# Altium footprint library klp.PcbLib: 436 footprints (part 25 of 28)
Each footprint in its own frame and in the unit in brackets; x right, y up, seen from the top. Pads: shape width x height; smd on the part's side, far side on the other; paste and mask are expansions set on the pad; w line width, h text height; cw(c..) or ccw(c..) is an arc to the next point about the centre after c.
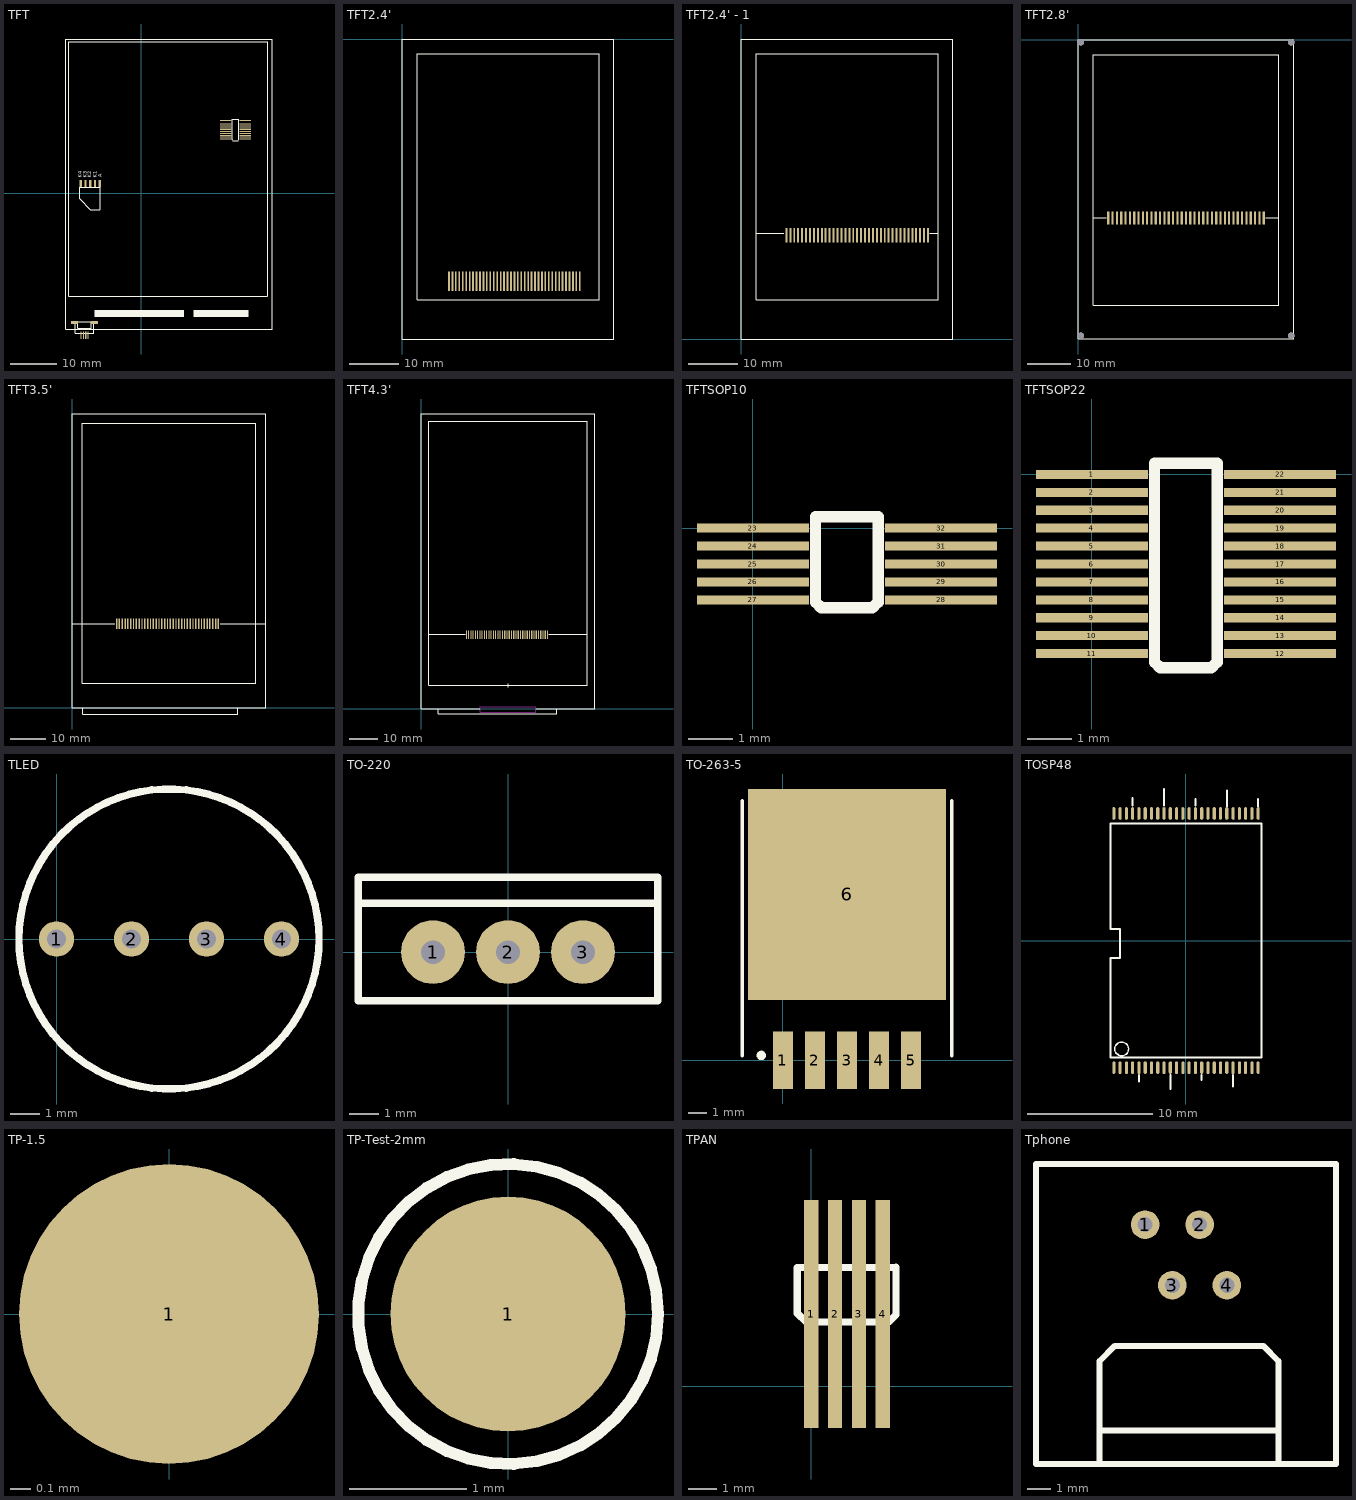
[diagram p24: the footprints below, top view; thin cyan lines are the x and y axes]

## TFT [mil] "TFTLCD_34"
height 196.85
pads (33):
  rect 98.43x8 smd: 1(710,615) 2(710,599.25) 3(710,583.5) 4(710,567.76) 5(710,552.01) 6(710,536.26) 7(710,520.51) 8(710,504.76) 9(710,489.02) 10(710,473.27) 11(710,457.52) 12(875.35,457.52) 13(875.35,473.27) 14(875.35,489.02) 15(875.35,504.76) 16(875.35,520.51) 17(875.35,536.26) 18(875.35,552.01) 19(875.35,567.76) 20(875.35,583.5) 21(875.35,599.25) 22(875.35,615)
  rect 19.68x59.05 smd: 23(-350,83.9) 24(-390,83.9) 26(-470,83.9) 27(-510,83.9)
  rect 19.68x59.06 smd: 25(-430,83.9)
  rect 10x62.99 smd: 28(-508,-1194) 29(-488,-1194) 30(-469,-1194) 31(-449,-1194)
  rect 59.06x23.62 smd: ""(-563,-1087) ""(-395,-1087)
Top Overlay:
  rectangle: 440,-1040 900,-980
  rectangle: -395,-1040 360,-980
  lines w10: -537,-1079.57 -537,-1133 -534,-1136 -424,-1136 -421,-1133 -421,-1079.57 ; -400.52,-1178 -558,-1178 -558,-1079.57 -400,-1079.57 -400,-1178 ; -350,-136.1 -430,-136.1 -520,-46.1 -520,53.9 -345,53.9 -345,-16.1 -345,-136.1 ; -635,-1145 -635,1300 1100,1300 1100,900 1100,-895 1100,-1145 -635,-1145 ; -610,-865.35 1060,-865.35 1065,-860.35 1065,1275 -610,1275 -610,-865.35 ; 765,450 770,445 815,445 820,450 820,625 765,625 765,450
  text "A" at -335,135 h30
  text "K1" at -375,130 h30
  text "K2" at -420,130 h30
  text "K3" at -460,130 h30
  text "K4" at -500,130 h30

## TFT2.4' [mm] "TFT,LCD,320*240,2.4',TOUCH,8/16bit"
height 5
pads (39):
  rect 0.35x4 smd: 1(9.5,-49.25) 2(10.2,-49.25) 3(10.9,-49.25) 4(11.6,-49.25) 5(12.3,-49.25) 6(13,-49.25) 7(13.7,-49.25) 8(14.4,-49.25) 9(15.1,-49.25) 10(15.8,-49.25) 11(16.5,-49.25) 12(17.2,-49.25) 13(17.9,-49.25) 14(18.6,-49.25) 15(19.3,-49.25) 16(20,-49.25) 17(20.7,-49.25) 18(21.4,-49.25) 19(22.1,-49.25) 20(22.8,-49.25) 21(23.5,-49.25) 22(24.2,-49.25) 23(24.9,-49.25) 24(25.6,-49.25) 25(26.3,-49.25) 26(27,-49.25) 27(27.7,-49.25) 28(28.4,-49.25) 29(29.1,-49.25) 30(29.8,-49.25) 31(30.5,-49.25) 32(31.2,-49.25) 33(31.9,-49.25) 34(32.6,-49.25) 35(33.3,-49.25) 36(34,-49.25) 37(34.7,-49.25) 38(35.4,-49.25) 39(36.1,-49.25)
Top Overlay:
  lines w0.254: 0,-61 43,-61 43,0 0,0 0,-61 ; 3.048,-53.048 40.005,-53.048 40.005,-3.048 3.048,-3.048 3.048,-53.048

## TFT2.4' - 1 [mm] "TFT,LCD,320*240,2.4',TOUCH,8/16bit,GENE"
height 5
pads (37):
  rect 0.4x3 smd: 1(9.173,21.082) 2(9.973,21.082) 3(10.773,21.082) 4(11.573,21.082) 5(12.373,21.082) 6(13.173,21.082) 7(13.973,21.082) 8(14.773,21.082) 9(15.573,21.082) 10(16.373,21.082) 11(17.173,21.082) 12(17.973,21.082) 13(18.773,21.082) 14(19.573,21.082) 15(20.373,21.082) 16(21.173,21.082) 17(21.973,21.082) 18(22.773,21.082) 19(23.573,21.082) 20(24.373,21.082) 21(25.173,21.082) 22(25.973,21.082) 23(26.773,21.082) 24(27.573,21.082) 25(28.373,21.082) 26(29.173,21.082) 27(29.973,21.082) 28(30.773,21.082) 29(31.573,21.082) 30(32.373,21.082) 31(33.173,21.082) 32(33.973,21.082) 33(34.773,21.082) 34(35.573,21.082) 35(36.373,21.082) 36(37.173,21.082) 37(37.973,21.082)
Top Overlay:
  lines w0.254: 3.175,21.463 8.636,21.463 ; 38.354,21.463 40.005,21.463 ; 0,0 0,61 43,61 43,0 0,0 ; 3.048,7.952 3.048,57.952 40.005,57.952 40.005,7.952 3.048,7.952

## TFT2.8' [mm] "TFT,LCD,320*240,2.8',TOUCH,8/16bit"
height 5
pads (41):
  rect 0.5x3 smd: 1(7,-41.375) 2(8,-41.375) 3(9,-41.375) 4(10,-41.375) 5(11,-41.375) 6(12,-41.375) 7(13,-41.375) 8(14,-41.375) 9(15,-41.375) 10(16,-41.375) 11(17,-41.375) 12(18,-41.375) 13(19,-41.375) 14(20,-41.375) 15(21,-41.375) 16(22,-41.375) 17(23,-41.375) 18(24,-41.375) 19(25,-41.375) 20(26,-41.375) 21(27,-41.375) 22(28,-41.375) 23(29,-41.375) 24(30,-41.375) 25(31,-41.375) 26(32,-41.375) 27(33,-41.375) 28(34,-41.375) 29(35,-41.375) 30(36,-41.375) 31(37,-41.375) 32(38,-41.375) 33(39,-41.375) 34(40,-41.375) 35(41,-41.375) 36(42,-41.375) 37(43,-41.375)
  round 1.5 hole 1.5: 38(49.375,-0.625) 39(0.625,-0.625) 40(49.375,-68.625) 41(0.625,-68.625)
Top Overlay:
  lines w0.254: 3.5,-41.275 6.477,-41.275 ; 43.461,-41.275 46.5,-41.275 ; 0,-69.3 50,-69.3 50,0 0,0 0,-69.3 ; 3.5,-61.6 46.5,-61.6 46.5,-3.5 3.5,-3.5 3.5,-61.6

## TFT3.5' [mm]
pads (37):
  rect 0.4x3 smd: 1(12.526,23.749) 2(13.326,23.749) 3(14.126,23.749) 4(14.926,23.749) 5(15.726,23.749) 6(16.526,23.749) 7(17.326,23.749) 8(18.126,23.749) 9(18.926,23.749) 10(19.726,23.749) 11(20.526,23.749) 12(21.326,23.749) 13(22.126,23.749) 14(22.926,23.749) 15(23.726,23.749) 16(24.526,23.749) 17(25.326,23.749) 18(26.126,23.749) 19(26.926,23.749) 20(27.726,23.749) 21(28.526,23.749) 22(29.326,23.749) 23(30.126,23.749) 24(30.926,23.749) 25(31.726,23.749) 26(32.526,23.749) 27(33.326,23.749) 28(34.126,23.749) 29(34.926,23.749) 30(35.726,23.749) 31(36.526,23.749) 32(37.326,23.749) 33(38.126,23.749) 34(38.926,23.749) 35(39.726,23.749) 36(40.526,23.749) 37(41.326,23.749)
Top Overlay:
  lines w0.203: 0,23.7 12.065,23.7 ; 3,0 3,-1.8 46.736,-1.8 46.736,0 ; 41.783,23.7 54.651,23.7 ; 0,0 0,83 54.7,83 54.7,0 0,0 ; 2.85,6.951 2.85,80.391 51.85,80.391 51.85,6.951 2.85,6.951

## TFT4.3' [mm]
pads (37):
  rect 0.4x3 smd: 1(16.006,26.396) 2(16.806,26.396) 3(17.606,26.396) 4(18.406,26.396) 5(19.206,26.396) 6(20.006,26.396) 7(20.806,26.396) 8(21.606,26.396) 9(22.406,26.396) 10(23.206,26.396) 11(24.006,26.396) 12(24.806,26.396) 13(25.606,26.396) 14(26.406,26.396) 15(27.206,26.396) 16(28.006,26.396) 17(28.806,26.396) 18(29.606,26.396) 19(30.406,26.396) 20(31.206,26.396) 21(32.006,26.396) 22(32.806,26.396) 23(33.606,26.396) 24(34.406,26.396) 25(35.206,26.396) 26(36.006,26.396) 27(36.806,26.396) 28(37.606,26.396) 29(38.406,26.396) 30(39.206,26.396) 31(40.006,26.396) 32(40.806,26.396) 33(41.606,26.396) 34(42.406,26.396) 35(43.206,26.396) 36(44.006,26.396) 37(44.806,26.396)
Top Overlay:
  lines w0.203: 2.7,26.416 15.621,26.416 ; 6,0 6,-1.8 48,-1.8 48,0 ; 20.7,0 0,0 0,104.65 61.56,104.65 61.56,0 40.85,0 ; 30.78,7.75 30.78,9 ; 45.212,26.416 58.86,26.416 ; 2.7,8.41 2.7,102.01 58.85,102.01 58.86,102 58.86,8.41 2.7,8.41
Keep-Out Layer:
  lines w0.203: 20.9,-1.25 40.66,-1.25 40.66,0.75 20.9,0.75 20.9,-1.25

## TFTSOP10 [mm]
pads (10):
  rect 2.5x0.203 smd: 23(0,0) 24(0,-0.4) 25(0,-0.8) 26(0,-1.2) 27(0,-1.6) 28(4.2,-1.6) 29(4.2,-1.2) 30(4.2,-0.8) 31(4.2,-0.4) 32(4.2,0)
Top Overlay:
  lines w0.254: 1.397,-1.651 1.524,-1.778 2.667,-1.778 2.794,-1.651 2.794,0.254 1.397,0.254 1.397,-1.651

## TFTSOP22 [mm]
pads (22):
  rect 2.5x0.203 smd: 1(0,0) 2(0,-0.4) 3(0,-0.8) 4(0,-1.2) 5(0,-1.6) 6(0,-2) 7(0,-2.4) 8(0,-2.8) 9(0,-3.2) 10(0,-3.6) 11(0,-4) 12(4.2,-4) 13(4.2,-3.6) 14(4.2,-3.2) 15(4.2,-2.8) 16(4.2,-2.4) 17(4.2,-2) 18(4.2,-1.6) 19(4.2,-1.2) 20(4.2,-0.8) 21(4.2,-0.4) 22(4.2,0)
Top Overlay:
  lines w0.254: 1.397,-4.191 1.397,0.254 2.794,0.254 2.794,-4.191 2.667,-4.318 1.524,-4.318 1.397,-4.191

## TLED [mm] "LED"
height 10
pads (4):
  round 1.2 hole 0.635: 1(0,0) 2(2.54,0) 3(5.08,0) 4(7.62,0)
Top Overlay:
  circle w0.254: c3.81,0 r5.082

## TO-220 [mil] "TO-220"
height 1181.1
pads (3):
  round 85 hole 31.5: 1(-100,0) 2(0,0) 3(100,0)
Top Overlay:
  lines w10: -200,65 -200,100 200,100 200,65 ; -200,65 -200,-65 200,-65 200,65 ; -200,65 100,65 200,65

## TO-263-5 [mil]
height 47.24
pads (6):
  rect 42x120 smd: 1(0,0) 2(66.93,0) 3(133.86,0) 4(200.79,0) 5(267.72,0)
  rect 414x440 smd: 6(133.86,346)
Top Overlay:
  circle w9.84: c-44.92,10 r4.92
  lines w7.87: -84.65,10 -84.65,541.5 ; 352.36,10 352.36,541.5

## TOSP48 [mm]
pads (48):
  oval 0.25x1 smd: 1(-5.75,-10.125) 2(-5.25,-10.125) 3(-4.75,-10.125) 4(-4.25,-10.125) 5(-3.75,-10.125) 6(-3.25,-10.125) 7(-2.75,-10.125) 8(-2.25,-10.125) 9(-1.75,-10.125) 10(-1.25,-10.125) 11(-0.75,-10.125) 12(-0.25,-10.125) 13(0.25,-10.125) 14(0.75,-10.125) 15(1.25,-10.125) 16(1.75,-10.125) 17(2.25,-10.125) 18(2.75,-10.125) 19(3.25,-10.125) 20(3.75,-10.125) 21(4.25,-10.125) 22(4.75,-10.125) 23(5.25,-10.125) 24(5.75,-10.125) 25(5.75,10.125) 26(5.25,10.125) 27(4.75,10.125) 28(4.25,10.125) 29(3.75,10.125) 30(3.25,10.125) 31(2.75,10.125) 32(2.25,10.125) 33(1.75,10.125) 34(1.25,10.125) 35(0.75,10.125) 36(0.25,10.125) 37(-0.25,10.125) 38(-0.75,10.125) 39(-1.25,10.125) 40(-1.75,10.125) 41(-2.25,10.125) 42(-2.75,10.125) 43(-3.25,10.125) 44(-3.75,10.125) 45(-4.25,10.125) 46(-4.75,10.125) 47(-5.25,10.125) 48(-5.75,10.125)
Top Overlay:
  circle w0.1: c-5.128,-8.632 r0.551
  lines w0.152: -4.25,10.775 -4.25,11.375 ; -3.75,-11.225 -3.75,-10.725 ; -1.75,10.775 -1.75,12.075 ; -1.25,-11.825 -1.25,-10.725 ; 0.75,10.775 0.75,11.275 ; 1.25,-11.125 1.25,-10.725 ; 3.25,10.675 3.25,11.975 ; 3.75,-11.625 3.75,-10.725 ; 5.75,10.675 5.75,11.275 ; -6,-9.325 6,-9.325 6,9.325 -6,9.325 -6,0.925 -5.25,0.925 -5.25,-1.375 -6,-1.375 -6,-9.325
3D body "User Library-TSOP48-1.STEP": height 1.2, standoff 0, extent -6.053,-10.157 6.047,10.043

## TP-1.5 [mm]
pads (1):
  round 1.5 smd: 1(0,0)

## TP-Test-2mm [mm]
pads (1):
  round 2 smd: 1(0,0)
Top Overlay:
  circle w0.1: c0,0 r1.275

## TPAN [mm] "TOUCH SCREEN"
pads (4):
  rect 0.5x8 smd: 1(0,2.54) 2(0.838,2.54) 3(1.676,2.54) 4(2.515,2.54)
Top Overlay:
  lines w0.254: -0.483,2.565 -0.178,2.261 2.718,2.261 2.972,2.515 2.972,4.191 2.946,4.166 -0.483,4.166 -0.483,2.565

## Tphone [mm] "Tphone"
height 13
pads (4):
  round 1.2 hole 0.635: 1(5.842,-5.08) 2(8.128,-5.08) 3(6.985,-7.62) 4(9.271,-7.62)
Top Overlay:
  lines w0.254: 3.937,-15.113 3.937,-10.795 4.572,-10.16 10.795,-10.16 11.43,-10.795 11.43,-15.113 ; 3.937,-13.716 11.43,-13.716 ; 12.192,-15.113 12.7,-15.113 ; 13.843,-12.446 13.843,-2.54 2.921,-2.54 1.27,-2.54 1.27,-12.446 1.27,-15.113 13.843,-15.113 13.843,-11.811